# Altium schematic symbol library Regulator_Linear.SchLib: 1452 symbols (part 1 of 10)
Pins are listed as number, name and electrical type; pins without a type are passive.

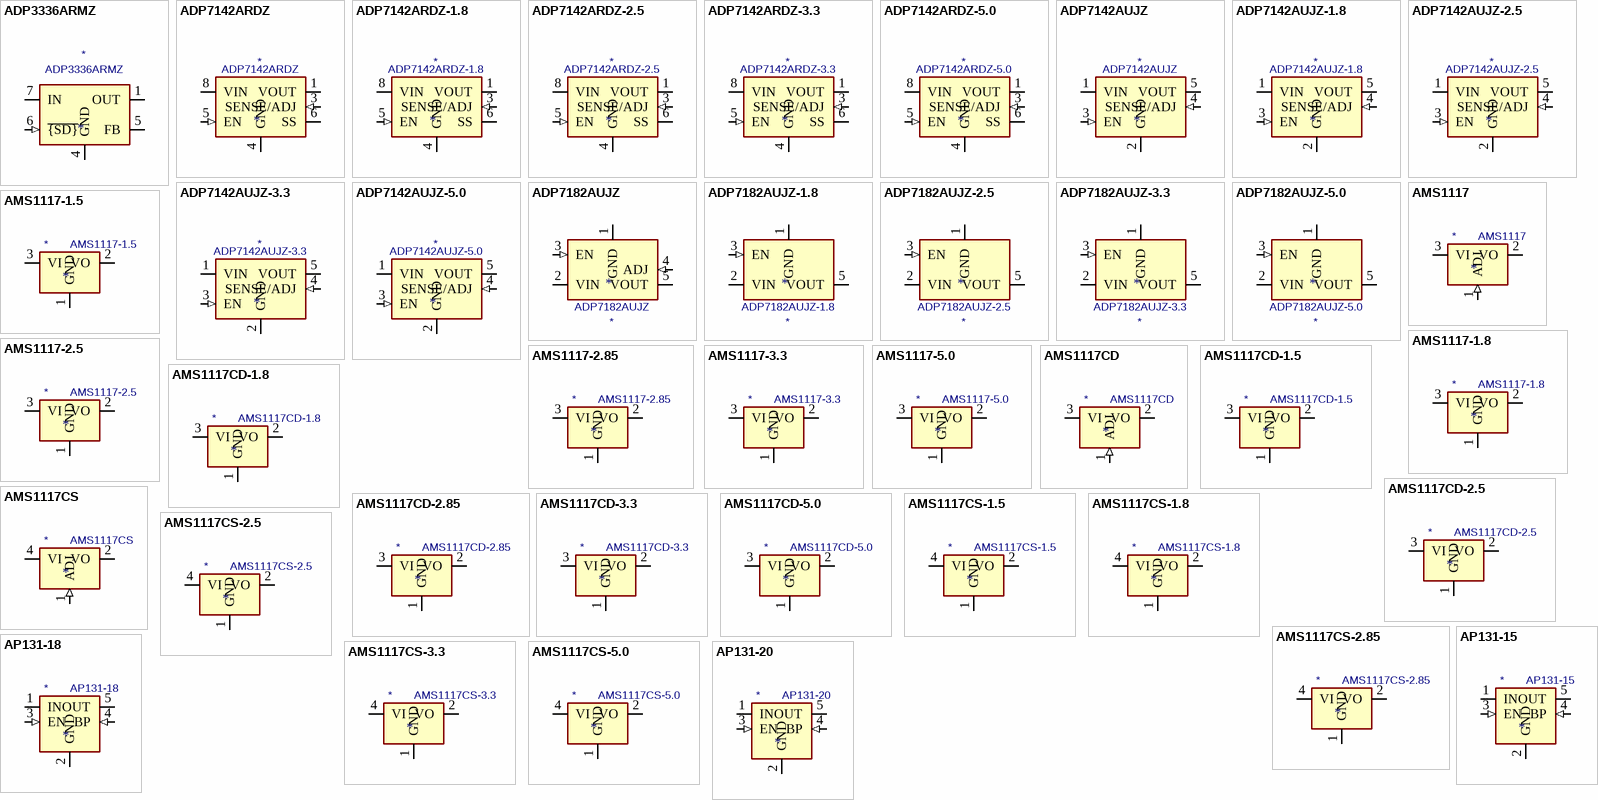
[diagram p0: symbols ADP3336ARMZ to AP131-20]

## ADP3336ARMZ
designator *  value ADP3336ARMZ
ki_keywords: linear regulator ldo adjustable positive; ki_description: High Accuracy Ultralow IQ, 500mA anyCAP Adjustable Low Dropout Regulator, MSOP-8; ki_fp_filters: MSOP*3x3mm*P0.65mm*; Footprint: Package_SO:MSOP-8_3x3mm_P0.65mm; Supplier: https://www.analog.com/media/en/technical-documentation/data-sheets/ADP3336.pdf
footprint MSOP-8_3x3mm_P0.65mm
pins: 1 OUT (power), 2 OUT hidden, 3 OUT hidden, 4 GND (power), 5 FB, 6 ~{{SD}} (in), 7 IN (power), 8 IN hidden

## ADP7142ARDZ
designator *  value ADP7142ARDZ
ki_keywords: linear regulator ldo adjustable positive; ki_description: 200mA, Low Noise, CMOS Low Dropout Regulator, Positive, Adjustable, SOIC-8; ki_fp_filters: SOIC*1EP*3.9x4.9mm*P1.27mm*; Footprint: Package_SO:SOIC-8-1EP_3.9x4.9mm_P1.27mm_EP2.29x3mm; Supplier: https://www.analog.com/media/en/technical-documentation/data-sheets/ADP7142.pdf
footprint SOIC-8-1EP_3.9x4.9mm_P1.27mm_EP2.29x3mm
pins: 1 VOUT (power), 2 VOUT hidden, 3 SENSE/ADJ (in), 4 GND (power), 5 EN (in), 6 SS, 7 VIN hidden, 8 VIN (power), 9 GND hidden

## ADP7142ARDZ-1.8
designator *  value ADP7142ARDZ-1.8
ki_keywords: linear regulator ldo fixed positive; ki_description: 200mA, Low Noise, CMOS Low Dropout Regulator, Positive, 1.8V Fixed Output, SOIC-8; ki_fp_filters: SOIC*1EP*3.9x4.9mm*P1.27mm*; Footprint: Package_SO:SOIC-8-1EP_3.9x4.9mm_P1.27mm_EP2.29x3mm; Supplier: https://www.analog.com/media/en/technical-documentation/data-sheets/ADP7142.pdf
footprint SOIC-8-1EP_3.9x4.9mm_P1.27mm_EP2.29x3mm
pins: 1 VOUT (power), 2 VOUT hidden, 3 SENSE/ADJ (in), 4 GND (power), 5 EN (in), 6 SS, 7 VIN hidden, 8 VIN (power), 9 GND hidden

## ADP7142ARDZ-2.5
designator *  value ADP7142ARDZ-2.5
ki_keywords: linear regulator ldo fixed positive; ki_description: 200mA, Low Noise, CMOS Low Dropout Regulator, Positive, 2.5V Fixed Output, SOIC-8; ki_fp_filters: SOIC*1EP*3.9x4.9mm*P1.27mm*; Footprint: Package_SO:SOIC-8-1EP_3.9x4.9mm_P1.27mm_EP2.29x3mm; Supplier: https://www.analog.com/media/en/technical-documentation/data-sheets/ADP7142.pdf
footprint SOIC-8-1EP_3.9x4.9mm_P1.27mm_EP2.29x3mm
pins: 1 VOUT (power), 2 VOUT hidden, 3 SENSE/ADJ (in), 4 GND (power), 5 EN (in), 6 SS, 7 VIN hidden, 8 VIN (power), 9 GND hidden

## ADP7142ARDZ-3.3
designator *  value ADP7142ARDZ-3.3
ki_keywords: linear regulator ldo fixed positive; ki_description: 200mA, Low Noise, CMOS Low Dropout Regulator, Positive, 3.3V Fixed Output, SOIC-8; ki_fp_filters: SOIC*1EP*3.9x4.9mm*P1.27mm*; Footprint: Package_SO:SOIC-8-1EP_3.9x4.9mm_P1.27mm_EP2.29x3mm; Supplier: https://www.analog.com/media/en/technical-documentation/data-sheets/ADP7142.pdf
footprint SOIC-8-1EP_3.9x4.9mm_P1.27mm_EP2.29x3mm
pins: 1 VOUT (power), 2 VOUT hidden, 3 SENSE/ADJ (in), 4 GND (power), 5 EN (in), 6 SS, 7 VIN hidden, 8 VIN (power), 9 GND hidden

## ADP7142ARDZ-5.0
designator *  value ADP7142ARDZ-5.0
ki_keywords: linear regulator ldo fixed positive; ki_description: 200mA, Low Noise, CMOS Low Dropout Regulator, Positive, 5.0V Fixed Output, SOIC-8; ki_fp_filters: SOIC*1EP*3.9x4.9mm*P1.27mm*; Footprint: Package_SO:SOIC-8-1EP_3.9x4.9mm_P1.27mm_EP2.29x3mm; Supplier: https://www.analog.com/media/en/technical-documentation/data-sheets/ADP7142.pdf
footprint SOIC-8-1EP_3.9x4.9mm_P1.27mm_EP2.29x3mm
pins: 1 VOUT (power), 2 VOUT hidden, 3 SENSE/ADJ (in), 4 GND (power), 5 EN (in), 6 SS, 7 VIN hidden, 8 VIN (power), 9 GND hidden

## ADP7142AUJZ
designator *  value ADP7142AUJZ
ki_keywords: linear regulator ldo adjustable positive; ki_description: 200mA, Low Noise, CMOS Low Dropout Regulator, Positive, Adjustable, TSOT-23-5; ki_fp_filters: TSOT?23*; Footprint: Package_TO_SOT_SMD:TSOT-23-5; Supplier: https://www.analog.com/media/en/technical-documentation/data-sheets/ADP7142.pdf
footprint TSOT-23-5
pins: 1 VIN (power), 2 GND (power), 3 EN (in), 4 SENSE/ADJ (in), 5 VOUT (power)

## ADP7142AUJZ-1.8
designator *  value ADP7142AUJZ-1.8
ki_keywords: linear regulator ldo fixed positive; ki_description: 200mA, Low Noise, CMOS Low Dropout Regulator, Positive, 1.8V Fixed Output, TSOT-23-5; ki_fp_filters: TSOT?23*; Footprint: Package_TO_SOT_SMD:TSOT-23-5; Supplier: https://www.analog.com/media/en/technical-documentation/data-sheets/ADP7142.pdf
footprint TSOT-23-5
pins: 1 VIN (power), 2 GND (power), 3 EN (in), 4 SENSE/ADJ (in), 5 VOUT (power)

## ADP7142AUJZ-2.5
designator *  value ADP7142AUJZ-2.5
ki_keywords: linear regulator ldo fixed positive; ki_description: 200mA, Low Noise, CMOS Low Dropout Regulator, Positive, 2.5V Fixed Output, TSOT-23-5; ki_fp_filters: TSOT?23*; Footprint: Package_TO_SOT_SMD:TSOT-23-5; Supplier: https://www.analog.com/media/en/technical-documentation/data-sheets/ADP7142.pdf
footprint TSOT-23-5
pins: 1 VIN (power), 2 GND (power), 3 EN (in), 4 SENSE/ADJ (in), 5 VOUT (power)

## ADP7142AUJZ-3.3
designator *  value ADP7142AUJZ-3.3
ki_keywords: linear regulator ldo fixed positive; ki_description: 200mA, Low Noise, CMOS Low Dropout Regulator, Positive, 3.3V Fixed Output, TSOT-23-5; ki_fp_filters: TSOT?23*; Footprint: Package_TO_SOT_SMD:TSOT-23-5; Supplier: https://www.analog.com/media/en/technical-documentation/data-sheets/ADP7142.pdf
footprint TSOT-23-5
pins: 1 VIN (power), 2 GND (power), 3 EN (in), 4 SENSE/ADJ (in), 5 VOUT (power)

## ADP7142AUJZ-5.0
designator *  value ADP7142AUJZ-5.0
ki_keywords: linear regulator ldo fixed positive; ki_description: 200mA, Low Noise, CMOS Low Dropout Regulator, Positive, 5.0V Fixed Output, TSOT-23-5; ki_fp_filters: TSOT?23*; Footprint: Package_TO_SOT_SMD:TSOT-23-5; Supplier: https://www.analog.com/media/en/technical-documentation/data-sheets/ADP7142.pdf
footprint TSOT-23-5
pins: 1 VIN (power), 2 GND (power), 3 EN (in), 4 SENSE/ADJ (in), 5 VOUT (power)

## ADP7182AUJZ
designator *  value ADP7182AUJZ
ki_keywords: linear regulator ldo adjustable negative; ki_description: 200mA, Low Noise, CMOS Low Dropout Regulator, Negative, Adjustable, TSOT-23-5; ki_fp_filters: TSOT?23*; Footprint: Package_TO_SOT_SMD:TSOT-23-5; Supplier: https://www.analog.com/media/en/technical-documentation/data-sheets/ADP7182.pdf
footprint TSOT-23-5
pins: 1 GND (power), 2 VIN (power), 3 EN (in), 4 ADJ (in), 5 VOUT (power)

## ADP7182AUJZ-1.8
designator *  value ADP7182AUJZ-1.8
ki_keywords: linear regulator ldo fixed negative; ki_description: 200mA, Low Noise, CMOS Low Dropout Regulator, Negative, -1.8V Fixed Output, TSOT-23-5; ki_fp_filters: TSOT?23*; Footprint: Package_TO_SOT_SMD:TSOT-23-5; Supplier: https://www.analog.com/media/en/technical-documentation/data-sheets/ADP7182.pdf
footprint TSOT-23-5
pins: 1 GND (power), 2 VIN (power), 3 EN (in), 4 NC (in) hidden, 5 VOUT (power)

## ADP7182AUJZ-2.5
designator *  value ADP7182AUJZ-2.5
ki_keywords: linear regulator ldo fixed negative; ki_description: 200mA, Low Noise, CMOS Low Dropout Regulator, Negative, -2.5V Fixed Output, TSOT-23-5; ki_fp_filters: TSOT?23*; Footprint: Package_TO_SOT_SMD:TSOT-23-5; Supplier: https://www.analog.com/media/en/technical-documentation/data-sheets/ADP7182.pdf
footprint TSOT-23-5
pins: 1 GND (power), 2 VIN (power), 3 EN (in), 4 NC (in) hidden, 5 VOUT (power)

## ADP7182AUJZ-3.3
designator *  value ADP7182AUJZ-3.3
ki_keywords: linear regulator ldo fixed negative; ki_description: 200mA, Low Noise, CMOS Low Dropout Regulator, Negative, -3.3V Fixed Output, TSOT-23-5; ki_fp_filters: TSOT?23*; Footprint: Package_TO_SOT_SMD:TSOT-23-5; Supplier: https://www.analog.com/media/en/technical-documentation/data-sheets/ADP7182.pdf
footprint TSOT-23-5
pins: 1 GND (power), 2 VIN (power), 3 EN (in), 4 NC (in) hidden, 5 VOUT (power)

## ADP7182AUJZ-5.0
designator *  value ADP7182AUJZ-5.0
ki_keywords: linear regulator ldo fixed negative; ki_description: 200mA, Low Noise, CMOS Low Dropout Regulator, Negative, -5.0V Fixed Output, TSOT-23-5; ki_fp_filters: TSOT?23*; Footprint: Package_TO_SOT_SMD:TSOT-23-5; Supplier: https://www.analog.com/media/en/technical-documentation/data-sheets/ADP7182.pdf
footprint TSOT-23-5
pins: 1 GND (power), 2 VIN (power), 3 EN (in), 4 NC (in) hidden, 5 VOUT (power)

## AMS1117
designator *  value AMS1117
ki_keywords: linear regulator ldo adjustable positive; ki_description: 1A Low Dropout regulator, positive, adjustable output, SOT-223; ki_fp_filters: SOT?223*TabPin2*; Footprint: Package_TO_SOT_SMD:SOT-223-3_TabPin2; Supplier: http://www.advanced-monolithic.com/pdf/ds1117.pdf
footprint SOT-223-3_TabPin2
pins: 1 ADJ (in), 2 VO (power), 3 VI (power)

## AMS1117-1.5
designator *  value AMS1117-1.5
ki_keywords: linear regulator ldo fixed positive; ki_description: 1A Low Dropout regulator, positive, 1.5V fixed output, SOT-223; ki_fp_filters: SOT?223*TabPin2*; Footprint: Package_TO_SOT_SMD:SOT-223-3_TabPin2; Supplier: http://www.advanced-monolithic.com/pdf/ds1117.pdf
footprint SOT-223-3_TabPin2
pins: 1 GND (power), 2 VO (power), 3 VI (power)

## AMS1117-1.8
designator *  value AMS1117-1.8
ki_keywords: linear regulator ldo fixed positive; ki_description: 1A Low Dropout regulator, positive, 1.8V fixed output, SOT-223; ki_fp_filters: SOT?223*TabPin2*; Footprint: Package_TO_SOT_SMD:SOT-223-3_TabPin2; Supplier: http://www.advanced-monolithic.com/pdf/ds1117.pdf
footprint SOT-223-3_TabPin2
pins: 1 GND (power), 2 VO (power), 3 VI (power)

## AMS1117-2.5
designator *  value AMS1117-2.5
ki_keywords: linear regulator ldo fixed positive; ki_description: 1A Low Dropout regulator, positive, 2.5V fixed output, SOT-223; ki_fp_filters: SOT?223*TabPin2*; Footprint: Package_TO_SOT_SMD:SOT-223-3_TabPin2; Supplier: http://www.advanced-monolithic.com/pdf/ds1117.pdf
footprint SOT-223-3_TabPin2
pins: 1 GND (power), 2 VO (power), 3 VI (power)

## AMS1117-2.85
designator *  value AMS1117-2.85
ki_keywords: linear regulator ldo fixed positive; ki_description: 1A Low Dropout regulator, positive, 2.85V fixed output, SOT-223; ki_fp_filters: SOT?223*TabPin2*; Footprint: Package_TO_SOT_SMD:SOT-223-3_TabPin2; Supplier: http://www.advanced-monolithic.com/pdf/ds1117.pdf
footprint SOT-223-3_TabPin2
pins: 1 GND (power), 2 VO (power), 3 VI (power)

## AMS1117-3.3
designator *  value AMS1117-3.3
ki_keywords: linear regulator ldo fixed positive; ki_description: 1A Low Dropout regulator, positive, 3.3V fixed output, SOT-223; ki_fp_filters: SOT?223*TabPin2*; Footprint: Package_TO_SOT_SMD:SOT-223-3_TabPin2; Supplier: http://www.advanced-monolithic.com/pdf/ds1117.pdf
footprint SOT-223-3_TabPin2
pins: 1 GND (power), 2 VO (power), 3 VI (power)

## AMS1117-5.0
designator *  value AMS1117-5.0
ki_keywords: linear regulator ldo fixed positive; ki_description: 1A Low Dropout regulator, positive, 5.0V fixed output, SOT-223; ki_fp_filters: SOT?223*TabPin2*; Footprint: Package_TO_SOT_SMD:SOT-223-3_TabPin2; Supplier: http://www.advanced-monolithic.com/pdf/ds1117.pdf
footprint SOT-223-3_TabPin2
pins: 1 GND (power), 2 VO (power), 3 VI (power)

## AMS1117CD
designator *  value AMS1117CD
ki_keywords: linear regulator ldo fixed positive; ki_description: 1A Low Dropout regulator, positive, adjustable output, TO-252; ki_fp_filters: TO?252*TabPin2*; Footprint: Package_TO_SOT_SMD:TO-252-3_TabPin2; Supplier: http://www.advanced-monolithic.com/pdf/ds1117.pdf
footprint TO-252-3_TabPin2
pins: 1 ADJ (in), 2 VO (power), 3 VI (power)

## AMS1117CD-1.5
designator *  value AMS1117CD-1.5
ki_keywords: linear regulator ldo fixed positive; ki_description: 1A Low Dropout regulator, positive, 1.5V fixed output, TO-252; ki_fp_filters: TO?252*TabPin2*; Footprint: Package_TO_SOT_SMD:TO-252-3_TabPin2; Supplier: http://www.advanced-monolithic.com/pdf/ds1117.pdf
footprint TO-252-3_TabPin2
pins: 1 GND (power), 2 VO (power), 3 VI (power)

## AMS1117CD-1.8
designator *  value AMS1117CD-1.8
ki_keywords: linear regulator ldo fixed positive; ki_description: 1A Low Dropout regulator, positive, 1.8V fixed output, TO-252; ki_fp_filters: TO?252*TabPin2*; Footprint: Package_TO_SOT_SMD:TO-252-3_TabPin2; Supplier: http://www.advanced-monolithic.com/pdf/ds1117.pdf
footprint TO-252-3_TabPin2
pins: 1 GND (power), 2 VO (power), 3 VI (power)

## AMS1117CD-2.5
designator *  value AMS1117CD-2.5
ki_keywords: linear regulator ldo fixed positive; ki_description: 1A Low Dropout regulator, positive, 2.5V fixed output, TO-252; ki_fp_filters: TO?252*TabPin2*; Footprint: Package_TO_SOT_SMD:TO-252-3_TabPin2; Supplier: http://www.advanced-monolithic.com/pdf/ds1117.pdf
footprint TO-252-3_TabPin2
pins: 1 GND (power), 2 VO (power), 3 VI (power)

## AMS1117CD-2.85
designator *  value AMS1117CD-2.85
ki_keywords: linear regulator ldo fixed positive; ki_description: 1A Low Dropout regulator, positive, 2.85V fixed output, TO-252; ki_fp_filters: TO?252*TabPin2*; Footprint: Package_TO_SOT_SMD:TO-252-3_TabPin2; Supplier: http://www.advanced-monolithic.com/pdf/ds1117.pdf
footprint TO-252-3_TabPin2
pins: 1 GND (power), 2 VO (power), 3 VI (power)

## AMS1117CD-3.3
designator *  value AMS1117CD-3.3
ki_keywords: linear regulator ldo fixed positive; ki_description: 1A Low Dropout regulator, positive, 3.3V fixed output, TO-252; ki_fp_filters: TO?252*TabPin2*; Footprint: Package_TO_SOT_SMD:TO-252-3_TabPin2; Supplier: http://www.advanced-monolithic.com/pdf/ds1117.pdf
footprint TO-252-3_TabPin2
pins: 1 GND (power), 2 VO (power), 3 VI (power)

## AMS1117CD-5.0
designator *  value AMS1117CD-5.0
ki_keywords: linear regulator ldo fixed positive; ki_description: 1A Low Dropout regulator, positive, 5.0V fixed output, TO-252; ki_fp_filters: TO?252*TabPin2*; Footprint: Package_TO_SOT_SMD:TO-252-3_TabPin2; Supplier: http://www.advanced-monolithic.com/pdf/ds1117.pdf
footprint TO-252-3_TabPin2
pins: 1 GND (power), 2 VO (power), 3 VI (power)

## AMS1117CS
designator *  value AMS1117CS
ki_keywords: linear regulator ldo fixed positive; ki_description: 1A Low Dropout regulator, positive, adjustable output, SOIC-8; ki_fp_filters: SOIC*3.9x4.9mm*P1.27mm*; Footprint: Package_SO:SOIC-8_3.9x4.9mm_P1.27mm; Supplier: http://www.advanced-monolithic.com/pdf/ds1117.pdf
footprint SOIC-8_3.9x4.9mm_P1.27mm
pins: 1 ADJ (in), 2 VO (power), 3 VO hidden, 4 VI (power), 5 NC (in) hidden, 6 VO hidden, 7 VO hidden, 8 NC (in) hidden

## AMS1117CS-1.5
designator *  value AMS1117CS-1.5
ki_keywords: linear regulator ldo fixed positive; ki_description: 1A Low Dropout regulator, positive, 1.5V fixed output, SOIC-8; ki_fp_filters: SOIC*3.9x4.9mm*P1.27mm*; Footprint: Package_SO:SOIC-8_3.9x4.9mm_P1.27mm; Supplier: http://www.advanced-monolithic.com/pdf/ds1117.pdf
footprint SOIC-8_3.9x4.9mm_P1.27mm
pins: 1 GND (power), 2 VO (power), 3 VO hidden, 4 VI (power), 5 NC (in) hidden, 6 VO hidden, 7 VO hidden, 8 NC (in) hidden

## AMS1117CS-1.8
designator *  value AMS1117CS-1.8
ki_keywords: linear regulator ldo fixed positive; ki_description: 1A Low Dropout regulator, positive, 1.8V fixed output, SOIC-8; ki_fp_filters: SOIC*3.9x4.9mm*P1.27mm*; Footprint: Package_SO:SOIC-8_3.9x4.9mm_P1.27mm; Supplier: http://www.advanced-monolithic.com/pdf/ds1117.pdf
footprint SOIC-8_3.9x4.9mm_P1.27mm
pins: 1 GND (power), 2 VO (power), 3 VO hidden, 4 VI (power), 5 NC (in) hidden, 6 VO hidden, 7 VO hidden, 8 NC (in) hidden

## AMS1117CS-2.5
designator *  value AMS1117CS-2.5
ki_keywords: linear regulator ldo fixed positive; ki_description: 1A Low Dropout regulator, positive, 2.5V fixed output, SOIC-8; ki_fp_filters: SOIC*3.9x4.9mm*P1.27mm*; Footprint: Package_SO:SOIC-8_3.9x4.9mm_P1.27mm; Supplier: http://www.advanced-monolithic.com/pdf/ds1117.pdf
footprint SOIC-8_3.9x4.9mm_P1.27mm
pins: 1 GND (power), 2 VO (power), 3 VO hidden, 4 VI (power), 5 NC (in) hidden, 6 VO hidden, 7 VO hidden, 8 NC (in) hidden

## AMS1117CS-2.85
designator *  value AMS1117CS-2.85
ki_keywords: linear regulator ldo fixed positive; ki_description: 1A Low Dropout regulator, positive, 2.85V fixed output, SOIC-8; ki_fp_filters: SOIC*3.9x4.9mm*P1.27mm*; Footprint: Package_SO:SOIC-8_3.9x4.9mm_P1.27mm; Supplier: http://www.advanced-monolithic.com/pdf/ds1117.pdf
footprint SOIC-8_3.9x4.9mm_P1.27mm
pins: 1 GND (power), 2 VO (power), 3 VO hidden, 4 VI (power), 5 NC (in) hidden, 6 VO hidden, 7 VO hidden, 8 NC (in) hidden

## AMS1117CS-3.3
designator *  value AMS1117CS-3.3
ki_keywords: linear regulator ldo fixed positive; ki_description: 1A Low Dropout regulator, positive, 3.3V fixed output, SOIC-8; ki_fp_filters: SOIC*3.9x4.9mm*P1.27mm*; Footprint: Package_SO:SOIC-8_3.9x4.9mm_P1.27mm; Supplier: http://www.advanced-monolithic.com/pdf/ds1117.pdf
footprint SOIC-8_3.9x4.9mm_P1.27mm
pins: 1 GND (power), 2 VO (power), 3 VO hidden, 4 VI (power), 5 NC (in) hidden, 6 VO hidden, 7 VO hidden, 8 NC (in) hidden

## AMS1117CS-5.0
designator *  value AMS1117CS-5.0
ki_keywords: linear regulator ldo fixed positive; ki_description: 1A Low Dropout regulator, positive, 5.0V fixed output, SOIC-8; ki_fp_filters: SOIC*3.9x4.9mm*P1.27mm*; Footprint: Package_SO:SOIC-8_3.9x4.9mm_P1.27mm; Supplier: http://www.advanced-monolithic.com/pdf/ds1117.pdf
footprint SOIC-8_3.9x4.9mm_P1.27mm
pins: 1 GND (power), 2 VO (power), 3 VO hidden, 4 VI (power), 5 NC (in) hidden, 6 VO hidden, 7 VO hidden, 8 NC (in) hidden

## AP131-15
designator *  value AP131-15
ki_keywords: linear regulator ldo fixed positive; ki_description: 300mA low dropout linear regulator, shutdown pin, 1.5V fixed positive output, SOT-23-5; ki_fp_filters: SOT?23*; Footprint: Package_TO_SOT_SMD:SOT-23-5; Supplier: http://www.diodes.com/_files/datasheets/AP131.pdf
footprint SOT-23-5
pins: 1 IN (power), 2 GND (power), 3 EN (in), 4 BP (in), 5 OUT (power)

## AP131-18
designator *  value AP131-18
ki_keywords: linear regulator ldo fixed positive; ki_description: 300mA low dropout linear regulator, shutdown pin, 1.8V fixed positive output, SOT-23-5; ki_fp_filters: SOT?23*; Footprint: Package_TO_SOT_SMD:SOT-23-5; Supplier: http://www.diodes.com/_files/datasheets/AP131.pdf
footprint SOT-23-5
pins: 1 IN (power), 2 GND (power), 3 EN (in), 4 BP (in), 5 OUT (power)

## AP131-20
designator *  value AP131-20
ki_keywords: linear regulator ldo fixed positive; ki_description: 300mA low dropout linear regulator, shutdown pin, 2.0V fixed positive output, SOT-23-5; ki_fp_filters: SOT?23*; Footprint: Package_TO_SOT_SMD:SOT-23-5; Supplier: http://www.diodes.com/_files/datasheets/AP131.pdf
footprint SOT-23-5
pins: 1 IN (power), 2 GND (power), 3 EN (in), 4 BP (in), 5 OUT (power)

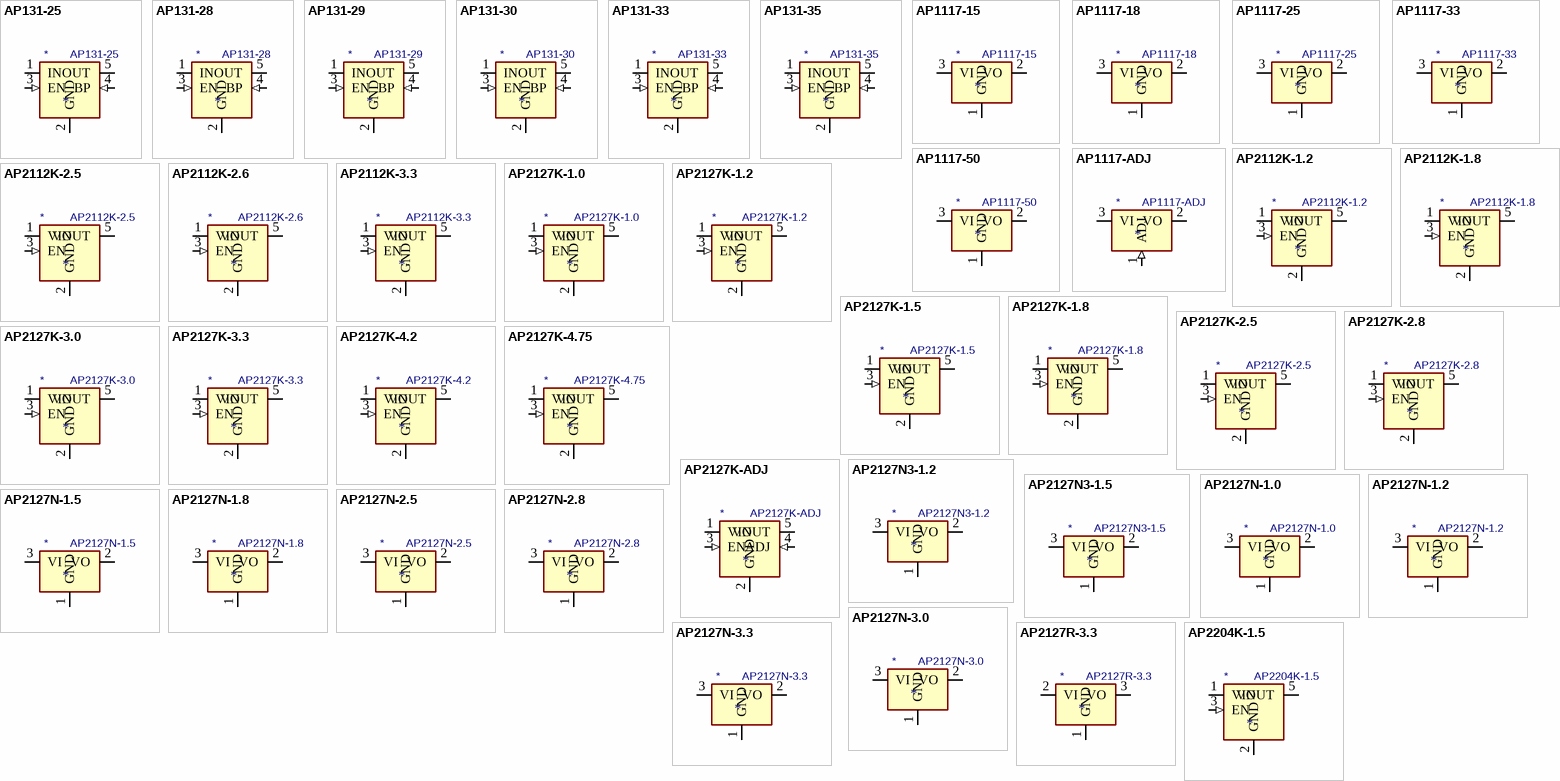
[diagram p1: symbols AP131-25 to AP2204K-1.5]

## AP131-25
designator *  value AP131-25
ki_keywords: linear regulator ldo fixed positive; ki_description: 300mA low dropout linear regulator, shutdown pin, 2.5V fixed positive output, SOT-23-5; ki_fp_filters: SOT?23*; Footprint: Package_TO_SOT_SMD:SOT-23-5; Supplier: http://www.diodes.com/_files/datasheets/AP131.pdf
footprint SOT-23-5
pins: 1 IN (power), 2 GND (power), 3 EN (in), 4 BP (in), 5 OUT (power)

## AP131-28
designator *  value AP131-28
ki_keywords: linear regulator ldo fixed positive; ki_description: 300mA low dropout linear regulator, shutdown pin, 2.8V fixed positive output, SOT-23-5; ki_fp_filters: SOT?23*; Footprint: Package_TO_SOT_SMD:SOT-23-5; Supplier: http://www.diodes.com/_files/datasheets/AP131.pdf
footprint SOT-23-5
pins: 1 IN (power), 2 GND (power), 3 EN (in), 4 BP (in), 5 OUT (power)

## AP131-29
designator *  value AP131-29
ki_keywords: linear regulator ldo fixed positive; ki_description: 300mA low dropout linear regulator, shutdown pin, 2.9V fixed positive output, SOT-23-5; ki_fp_filters: SOT?23*; Footprint: Package_TO_SOT_SMD:SOT-23-5; Supplier: http://www.diodes.com/_files/datasheets/AP131.pdf
footprint SOT-23-5
pins: 1 IN (power), 2 GND (power), 3 EN (in), 4 BP (in), 5 OUT (power)

## AP131-30
designator *  value AP131-30
ki_keywords: linear regulator ldo fixed positive; ki_description: 300mA low dropout linear regulator, shutdown pin, 3.0V fixed positive output, SOT-23-5; ki_fp_filters: SOT?23*; Footprint: Package_TO_SOT_SMD:SOT-23-5; Supplier: http://www.diodes.com/_files/datasheets/AP131.pdf
footprint SOT-23-5
pins: 1 IN (power), 2 GND (power), 3 EN (in), 4 BP (in), 5 OUT (power)

## AP131-33
designator *  value AP131-33
ki_keywords: linear regulator ldo fixed positive; ki_description: 300mA low dropout linear regulator, shutdown pin, 3.3V fixed positive output, SOT-23-5; ki_fp_filters: SOT?23*; Footprint: Package_TO_SOT_SMD:SOT-23-5; Supplier: http://www.diodes.com/_files/datasheets/AP131.pdf
footprint SOT-23-5
pins: 1 IN (power), 2 GND (power), 3 EN (in), 4 BP (in), 5 OUT (power)

## AP131-35
designator *  value AP131-35
ki_keywords: linear regulator ldo fixed positive; ki_description: 300mA low dropout linear regulator, shutdown pin, 3.5V fixed positive output, SOT-23-5; ki_fp_filters: SOT?23*; Footprint: Package_TO_SOT_SMD:SOT-23-5; Supplier: http://www.diodes.com/_files/datasheets/AP131.pdf
footprint SOT-23-5
pins: 1 IN (power), 2 GND (power), 3 EN (in), 4 BP (in), 5 OUT (power)

## AP1117-15
designator *  value AP1117-15
ki_keywords: linear regulator ldo fixed positive obsolete; ki_description: 1A Low Dropout regulator, positive, 1.5V fixed output, SOT-223; ki_fp_filters: SOT?223*TabPin2*; Footprint: Package_TO_SOT_SMD:SOT-223-3_TabPin2; Supplier: http://www.diodes.com/datasheets/AP1117.pdf
footprint SOT-223-3_TabPin2
pins: 1 GND (power), 2 VO (power), 3 VI (power)

## AP1117-18
designator *  value AP1117-18
ki_keywords: linear regulator ldo fixed positive obsolete; ki_description: 1A Low Dropout regulator, positive, 1.8V fixed output, SOT-223; ki_fp_filters: SOT?223*TabPin2*; Footprint: Package_TO_SOT_SMD:SOT-223-3_TabPin2; Supplier: http://www.diodes.com/datasheets/AP1117.pdf
footprint SOT-223-3_TabPin2
pins: 1 GND (power), 2 VO (power), 3 VI (power)

## AP1117-25
designator *  value AP1117-25
ki_keywords: linear regulator ldo fixed positive obsolete; ki_description: 1A Low Dropout regulator, positive, 2.5V fixed output, SOT-223; ki_fp_filters: SOT?223*TabPin2*; Footprint: Package_TO_SOT_SMD:SOT-223-3_TabPin2; Supplier: http://www.diodes.com/datasheets/AP1117.pdf
footprint SOT-223-3_TabPin2
pins: 1 GND (power), 2 VO (power), 3 VI (power)

## AP1117-33
designator *  value AP1117-33
ki_keywords: linear regulator ldo fixed positive obsolete; ki_description: 1A Low Dropout regulator, positive, 3.3V fixed output, SOT-223; ki_fp_filters: SOT?223*TabPin2*; Footprint: Package_TO_SOT_SMD:SOT-223-3_TabPin2; Supplier: http://www.diodes.com/datasheets/AP1117.pdf
footprint SOT-223-3_TabPin2
pins: 1 GND (power), 2 VO (power), 3 VI (power)

## AP1117-50
designator *  value AP1117-50
ki_keywords: linear regulator ldo fixed positive obsolete; ki_description: 1A Low Dropout regulator, positive, 5.0V fixed output, SOT-223; ki_fp_filters: SOT?223*TabPin2*; Footprint: Package_TO_SOT_SMD:SOT-223-3_TabPin2; Supplier: http://www.diodes.com/datasheets/AP1117.pdf
footprint SOT-223-3_TabPin2
pins: 1 GND (power), 2 VO (power), 3 VI (power)

## AP1117-ADJ
designator *  value AP1117-ADJ
ki_keywords: linear regulator ldo adjustable positive obsolete; ki_description: 1A Low Dropout regulator, positive, adjustable output, SOT-223; ki_fp_filters: SOT?223*TabPin2*; Footprint: Package_TO_SOT_SMD:SOT-223-3_TabPin2; Supplier: http://www.diodes.com/datasheets/AP1117.pdf
footprint SOT-223-3_TabPin2
pins: 1 ADJ (in), 2 VO (power), 3 VI (power)

## AP2112K-1.2
designator *  value AP2112K-1.2
ki_keywords: linear regulator ldo fixed positive; ki_description: 600mA low dropout linear regulator, with enable pin, 2.5V-6V input voltage range, 1.2V fixed positive output, SOT-23-5; ki_fp_filters: SOT?23?5*; Footprint: Package_TO_SOT_SMD:SOT-23-5; Supplier: https://www.diodes.com/assets/Datasheets/AP2112.pdf
footprint SOT-23-5
pins: 1 VIN (power), 2 GND (power), 3 EN (in), 4 NC (in) hidden, 5 VOUT (power)

## AP2112K-1.8
designator *  value AP2112K-1.8
ki_keywords: linear regulator ldo fixed positive; ki_description: 600mA low dropout linear regulator, with enable pin, 2.5V-6V input voltage range, 1.8V fixed positive output, SOT-23-5; ki_fp_filters: SOT?23?5*; Footprint: Package_TO_SOT_SMD:SOT-23-5; Supplier: https://www.diodes.com/assets/Datasheets/AP2112.pdf
footprint SOT-23-5
pins: 1 VIN (power), 2 GND (power), 3 EN (in), 4 NC (in) hidden, 5 VOUT (power)

## AP2112K-2.5
designator *  value AP2112K-2.5
ki_keywords: linear regulator ldo fixed positive; ki_description: 600mA low dropout linear regulator, with enable pin, 3V-6V input voltage range, 2.5V fixed positive output, SOT-23-5; ki_fp_filters: SOT?23?5*; Footprint: Package_TO_SOT_SMD:SOT-23-5; Supplier: https://www.diodes.com/assets/Datasheets/AP2112.pdf
footprint SOT-23-5
pins: 1 VIN (power), 2 GND (power), 3 EN (in), 4 NC (in) hidden, 5 VOUT (power)

## AP2112K-2.6
designator *  value AP2112K-2.6
ki_keywords: linear regulator ldo fixed positive; ki_description: 600mA low dropout linear regulator, with enable pin, 3.1V-6V input voltage range, 2.6V fixed positive output, SOT-23-5; ki_fp_filters: SOT?23?5*; Footprint: Package_TO_SOT_SMD:SOT-23-5; Supplier: https://www.diodes.com/assets/Datasheets/AP2112.pdf
footprint SOT-23-5
pins: 1 VIN (power), 2 GND (power), 3 EN (in), 4 NC (in) hidden, 5 VOUT (power)

## AP2112K-3.3
designator *  value AP2112K-3.3
ki_keywords: linear regulator ldo fixed positive; ki_description: 600mA low dropout linear regulator, with enable pin, 3.8V-6V input voltage range, 3.3V fixed positive output, SOT-23-5; ki_fp_filters: SOT?23?5*; Footprint: Package_TO_SOT_SMD:SOT-23-5; Supplier: https://www.diodes.com/assets/Datasheets/AP2112.pdf
footprint SOT-23-5
pins: 1 VIN (power), 2 GND (power), 3 EN (in), 4 NC (in) hidden, 5 VOUT (power)

## AP2127K-1.0
designator *  value AP2127K-1.0
ki_keywords: linear regulator ldo fixed positive; ki_description: 300mA low dropout linear regulator, shutdown pin, 2.5V-6V input voltage, 1.0V fixed positive output, SOT-23-5; ki_fp_filters: SOT?23?5*; Footprint: Package_TO_SOT_SMD:SOT-23-5; Supplier: https://www.diodes.com/assets/Datasheets/AP2127.pdf
footprint SOT-23-5
pins: 1 VIN (power), 2 GND (power), 3 EN (in), 4 NC (in) hidden, 5 VOUT (power)

## AP2127K-1.2
designator *  value AP2127K-1.2
ki_keywords: linear regulator ldo fixed positive; ki_description: 300mA low dropout linear regulator, shutdown pin, 2.5V-6V input voltage, 1.2V fixed positive output, SOT-23-5; ki_fp_filters: SOT?23?5*; Footprint: Package_TO_SOT_SMD:SOT-23-5; Supplier: https://www.diodes.com/assets/Datasheets/AP2127.pdf
footprint SOT-23-5
pins: 1 VIN (power), 2 GND (power), 3 EN (in), 4 NC (in) hidden, 5 VOUT (power)

## AP2127K-1.5
designator *  value AP2127K-1.5
ki_keywords: linear regulator ldo fixed positive; ki_description: 300mA low dropout linear regulator, shutdown pin, 2.5V-6V input voltage, 1.5V fixed positive output, SOT-23-5; ki_fp_filters: SOT?23?5*; Footprint: Package_TO_SOT_SMD:SOT-23-5; Supplier: https://www.diodes.com/assets/Datasheets/AP2127.pdf
footprint SOT-23-5
pins: 1 VIN (power), 2 GND (power), 3 EN (in), 4 NC (in) hidden, 5 VOUT (power)

## AP2127K-1.8
designator *  value AP2127K-1.8
ki_keywords: linear regulator ldo fixed positive; ki_description: 300mA low dropout linear regulator, shutdown pin, 2.5V-6V input voltage, 1.8V fixed positive output, SOT-23-5; ki_fp_filters: SOT?23?5*; Footprint: Package_TO_SOT_SMD:SOT-23-5; Supplier: https://www.diodes.com/assets/Datasheets/AP2127.pdf
footprint SOT-23-5
pins: 1 VIN (power), 2 GND (power), 3 EN (in), 4 NC (in) hidden, 5 VOUT (power)

## AP2127K-2.5
designator *  value AP2127K-2.5
ki_keywords: linear regulator ldo fixed positive; ki_description: 300mA low dropout linear regulator, shutdown pin, 2.5V-6V input voltage, 2.5V fixed positive output, SOT-23-5; ki_fp_filters: SOT?23?5*; Footprint: Package_TO_SOT_SMD:SOT-23-5; Supplier: https://www.diodes.com/assets/Datasheets/AP2127.pdf
footprint SOT-23-5
pins: 1 VIN (power), 2 GND (power), 3 EN (in), 4 NC (in) hidden, 5 VOUT (power)

## AP2127K-2.8
designator *  value AP2127K-2.8
ki_keywords: linear regulator ldo fixed positive; ki_description: 300mA low dropout linear regulator, shutdown pin, 2.5V-6V input voltage, 2.8V fixed positive output, SOT-23-5; ki_fp_filters: SOT?23?5*; Footprint: Package_TO_SOT_SMD:SOT-23-5; Supplier: https://www.diodes.com/assets/Datasheets/AP2127.pdf
footprint SOT-23-5
pins: 1 VIN (power), 2 GND (power), 3 EN (in), 4 NC (in) hidden, 5 VOUT (power)

## AP2127K-3.0
designator *  value AP2127K-3.0
ki_keywords: linear regulator ldo fixed positive; ki_description: 300mA low dropout linear regulator, shutdown pin, 2.5V-6V input voltage, 3.0V fixed positive output, SOT-23-5; ki_fp_filters: SOT?23?5*; Footprint: Package_TO_SOT_SMD:SOT-23-5; Supplier: https://www.diodes.com/assets/Datasheets/AP2127.pdf
footprint SOT-23-5
pins: 1 VIN (power), 2 GND (power), 3 EN (in), 4 NC (in) hidden, 5 VOUT (power)

## AP2127K-3.3
designator *  value AP2127K-3.3
ki_keywords: linear regulator ldo fixed positive; ki_description: 300mA low dropout linear regulator, shutdown pin, 2.5V-6V input voltage, 3.3V fixed positive output, SOT-23-5; ki_fp_filters: SOT?23?5*; Footprint: Package_TO_SOT_SMD:SOT-23-5; Supplier: https://www.diodes.com/assets/Datasheets/AP2127.pdf
footprint SOT-23-5
pins: 1 VIN (power), 2 GND (power), 3 EN (in), 4 NC (in) hidden, 5 VOUT (power)

## AP2127K-4.2
designator *  value AP2127K-4.2
ki_keywords: linear regulator ldo fixed positive; ki_description: 300mA low dropout linear regulator, shutdown pin, 2.5V-6V input voltage, 4.2V fixed positive output, SOT-23-5; ki_fp_filters: SOT?23?5*; Footprint: Package_TO_SOT_SMD:SOT-23-5; Supplier: https://www.diodes.com/assets/Datasheets/AP2127.pdf
footprint SOT-23-5
pins: 1 VIN (power), 2 GND (power), 3 EN (in), 4 NC (in) hidden, 5 VOUT (power)

## AP2127K-4.75
designator *  value AP2127K-4.75
ki_keywords: linear regulator ldo fixed positive; ki_description: 300mA low dropout linear regulator, shutdown pin, 2.5V-6V input voltage, 4.75V fixed positive output, SOT-23-5; ki_fp_filters: SOT?23?5*; Footprint: Package_TO_SOT_SMD:SOT-23-5; Supplier: https://www.diodes.com/assets/Datasheets/AP2127.pdf
footprint SOT-23-5
pins: 1 VIN (power), 2 GND (power), 3 EN (in), 4 NC (in) hidden, 5 VOUT (power)

## AP2127K-ADJ
designator *  value AP2127K-ADJ
ki_keywords: linear regulator ldo adjustable positive; ki_description: 300mA low dropout adjustable linear regulator, shutdown pin, 2.5V-6V input voltage, SOT-23-5 package; ki_fp_filters: SOT?23?5*; Footprint: Package_TO_SOT_SMD:SOT-23-5; Supplier: https://www.diodes.com/assets/Datasheets/AP2127.pdf
footprint SOT-23-5
pins: 1 VIN (power), 2 GND (power), 3 EN (in), 4 ADJ (in), 5 VOUT (power)

## AP2127N3-1.2
designator *  value AP2127N3-1.2
ki_keywords: linear regulator ldo fixed positive; ki_description: 300mA low dropout linear regulator, shutdown pin, 2.5V-6V input voltage, 1.2V fixed positive output, SOT-23-3 package; ki_fp_filters: TSOT?23*; Footprint: Package_TO_SOT_SMD:TSOT-23; Supplier: https://www.diodes.com/assets/Datasheets/AP2127.pdf
footprint TSOT-23
pins: 1 GND (power), 2 VO (power), 3 VI (power)

## AP2127N3-1.5
designator *  value AP2127N3-1.5
ki_keywords: linear regulator ldo fixed positive; ki_description: 300mA low dropout linear regulator, shutdown pin, 2.5V-6V input voltage, 1.5V fixed positive output, SOT-23-3 package; ki_fp_filters: TSOT?23*; Footprint: Package_TO_SOT_SMD:TSOT-23; Supplier: https://www.diodes.com/assets/Datasheets/AP2127.pdf
footprint TSOT-23
pins: 1 GND (power), 2 VO (power), 3 VI (power)

## AP2127N-1.0
designator *  value AP2127N-1.0
ki_keywords: linear regulator ldo fixed positive; ki_description: 300mA low dropout linear regulator, shutdown pin, 2.5V-6V input voltage, 1.0V fixed positive output, SOT-23 package; ki_fp_filters: SOT?23*; Footprint: Package_TO_SOT_SMD:SOT-23; Supplier: https://www.diodes.com/assets/Datasheets/AP2127.pdf
footprint SOT-23
pins: 1 GND (power), 2 VO (power), 3 VI (power)

## AP2127N-1.2
designator *  value AP2127N-1.2
ki_keywords: linear regulator ldo fixed positive; ki_description: 300mA low dropout linear regulator, shutdown pin, 2.5V-6V input voltage, 1.2V fixed positive output, SOT-23 package; ki_fp_filters: SOT?23*; Footprint: Package_TO_SOT_SMD:SOT-23; Supplier: https://www.diodes.com/assets/Datasheets/AP2127.pdf
footprint SOT-23
pins: 1 GND (power), 2 VO (power), 3 VI (power)

## AP2127N-1.5
designator *  value AP2127N-1.5
ki_keywords: linear regulator ldo fixed positive; ki_description: 300mA low dropout linear regulator, shutdown pin, 2.5V-6V input voltage, 1.5V fixed positive output, SOT-23 package; ki_fp_filters: SOT?23*; Footprint: Package_TO_SOT_SMD:SOT-23; Supplier: https://www.diodes.com/assets/Datasheets/AP2127.pdf
footprint SOT-23
pins: 1 GND (power), 2 VO (power), 3 VI (power)

## AP2127N-1.8
designator *  value AP2127N-1.8
ki_keywords: linear regulator ldo fixed positive; ki_description: 300mA low dropout linear regulator, shutdown pin, 2.5V-6V input voltage, 1.8V fixed positive output, SOT-23 package; ki_fp_filters: SOT?23*; Footprint: Package_TO_SOT_SMD:SOT-23; Supplier: https://www.diodes.com/assets/Datasheets/AP2127.pdf
footprint SOT-23
pins: 1 GND (power), 2 VO (power), 3 VI (power)
